# Altium schematic symbol library resistors.SchLib: 2602 symbols (part 18 of 18)
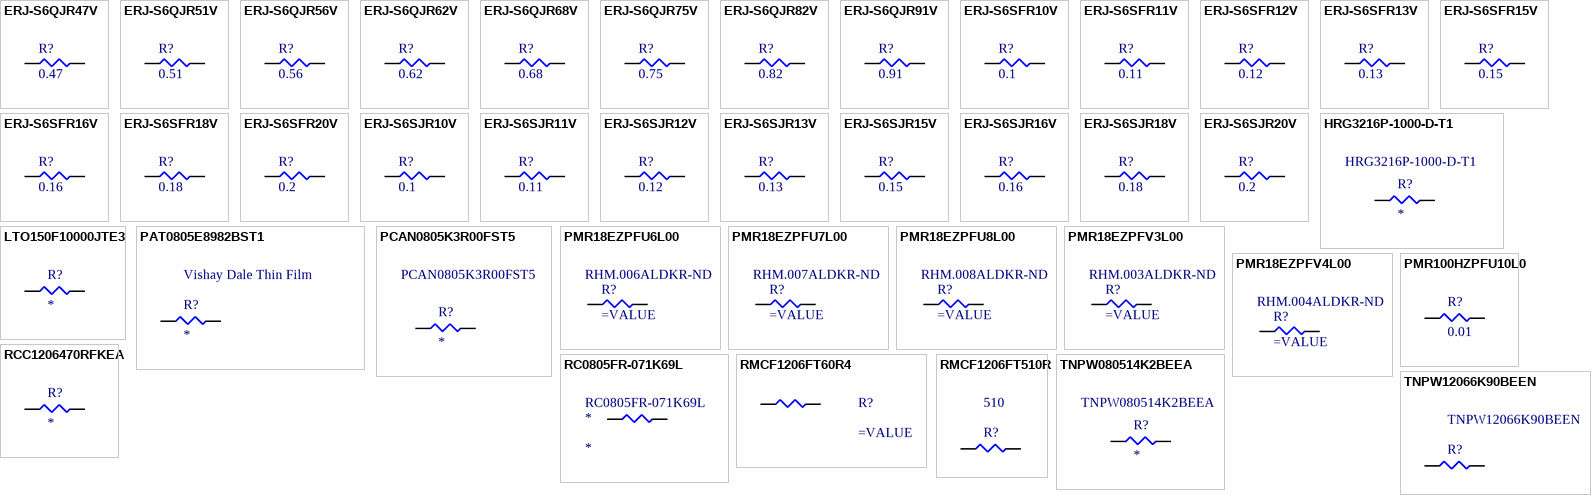
[diagram p81: symbols ERJ-S6QJR47V to TNPW080514K2BEEA]

## ERJ-S6SJR11V
designator R?, comment 0.11
RES SMD 0.11 OHM 5% 1/4W 0805; Part Number: ERJ-S6SJR11V; Manufacturer: Panasonic Electronic Components; Factory Stock: 0; Unit Price (USD): 0.07603; @ qty: 1500; Minimum Quantity: 1; Power (Watts): 0.25W, 1/4W; Temperature Coefficient: ±150ppm/°C; Datasheets: https://industrial.panasonic.com/cdbs/www-data/pdf/RDA0000/AOA0000CE5.pdf; Image: //media.digikey.com/Renders/Panasonic%20Renders/ERJ-0805%20Pkg.jpg; Digi-Key Part Number: P.11BKCT-ND; Quantity Available: 9666; Packaging: Cut Tape (CT); Series: ERJ; Part Status: Active; Value: 0.11; Tolerance: ±5%; Composition: Thick Film; Features: Anti-Sulfur, Automotive AEC-Q200; Operating Temperature: -55°C ~ 155°C; Package / Case: 0805 (2012 Metric); Supplier Device Package: 0805; Size / Dimension: 0.079" L x 0.049" W (2.00mm x 1.25mm); Height - Seated (Max): 0.026" (0.65mm); Number of Terminations: 2; Failure Rate: -
footprint SMD-0805-RES
pins: 1, 2

## ERJ-S6SJR12V
designator R?, comment 0.12
RES SMD 0.12 OHM 5% 1/4W 0805; Part Number: ERJ-S6SJR12V; Manufacturer: Panasonic Electronic Components; Factory Stock: 0; Unit Price (USD): 0.07603; @ qty: 1500; Minimum Quantity: 1; Power (Watts): 0.25W, 1/4W; Temperature Coefficient: ±150ppm/°C; Datasheets: https://industrial.panasonic.com/cdbs/www-data/pdf/RDA0000/AOA0000CE5.pdf; Image: //media.digikey.com/Renders/Panasonic%20Renders/ERJ-0805%20Pkg.jpg; Digi-Key Part Number: P.12BKCT-ND; Quantity Available: 9061; Packaging: Cut Tape (CT); Series: ERJ; Part Status: Active; Value: 0.12; Tolerance: ±5%; Composition: Thick Film; Features: Anti-Sulfur, Automotive AEC-Q200; Operating Temperature: -55°C ~ 155°C; Package / Case: 0805 (2012 Metric); Supplier Device Package: 0805; Size / Dimension: 0.079" L x 0.049" W (2.00mm x 1.25mm); Height - Seated (Max): 0.026" (0.65mm); Number of Terminations: 2; Failure Rate: -
footprint SMD-0805-RES
pins: 1, 2

## ERJ-S6SJR13V
designator R?, comment 0.13
RES SMD 0.13 OHM 5% 1/4W 0805; Part Number: ERJ-S6SJR13V; Manufacturer: Panasonic Electronic Components; Factory Stock: 0; Unit Price (USD): 0.07603; @ qty: 1500; Minimum Quantity: 1; Power (Watts): 0.25W, 1/4W; Temperature Coefficient: ±150ppm/°C; Datasheets: https://industrial.panasonic.com/cdbs/www-data/pdf/RDA0000/AOA0000CE5.pdf; Image: //media.digikey.com/Renders/Panasonic%20Renders/ERJ-0805%20Pkg.jpg; Digi-Key Part Number: P.13BKCT-ND; Quantity Available: 5683; Packaging: Cut Tape (CT); Series: ERJ; Part Status: Active; Value: 0.13; Tolerance: ±5%; Composition: Thick Film; Features: Anti-Sulfur, Automotive AEC-Q200; Operating Temperature: -55°C ~ 155°C; Package / Case: 0805 (2012 Metric); Supplier Device Package: 0805; Size / Dimension: 0.079" L x 0.049" W (2.00mm x 1.25mm); Height - Seated (Max): 0.026" (0.65mm); Number of Terminations: 2; Failure Rate: -
footprint SMD-0805-RES
pins: 1, 2

## ERJ-S6SJR15V
designator R?, comment 0.15
RES SMD 0.15 OHM 5% 1/4W 0805; Part Number: ERJ-S6SJR15V; Manufacturer: Panasonic Electronic Components; Factory Stock: 0; Unit Price (USD): 0.07603; @ qty: 1500; Minimum Quantity: 1; Power (Watts): 0.25W, 1/4W; Temperature Coefficient: ±150ppm/°C; Datasheets: https://industrial.panasonic.com/cdbs/www-data/pdf/RDA0000/AOA0000CE5.pdf; Image: //media.digikey.com/Renders/Panasonic%20Renders/ERJ-0805%20Pkg.jpg; Digi-Key Part Number: P.15BKCT-ND; Quantity Available: 15525; Packaging: Cut Tape (CT); Series: ERJ; Part Status: Active; Value: 0.15; Tolerance: ±5%; Composition: Thick Film; Features: Anti-Sulfur, Automotive AEC-Q200; Operating Temperature: -55°C ~ 155°C; Package / Case: 0805 (2012 Metric); Supplier Device Package: 0805; Size / Dimension: 0.079" L x 0.049" W (2.00mm x 1.25mm); Height - Seated (Max): 0.026" (0.65mm); Number of Terminations: 2; Failure Rate: -
footprint SMD-0805-RES
pins: 1, 2

## ERJ-S6SJR16V
designator R?, comment 0.16
RES SMD 0.16 OHM 5% 1/4W 0805; Part Number: ERJ-S6SJR16V; Manufacturer: Panasonic Electronic Components; Factory Stock: 0; Unit Price (USD): 0.07603; @ qty: 1500; Minimum Quantity: 1; Power (Watts): 0.25W, 1/4W; Temperature Coefficient: ±150ppm/°C; Datasheets: https://industrial.panasonic.com/cdbs/www-data/pdf/RDA0000/AOA0000CE5.pdf; Image: //media.digikey.com/Renders/Panasonic%20Renders/ERJ-0805%20Pkg.jpg; Digi-Key Part Number: P.16BKCT-ND; Quantity Available: 9606; Packaging: Cut Tape (CT); Series: ERJ; Part Status: Active; Value: 0.16; Tolerance: ±5%; Composition: Thick Film; Features: Anti-Sulfur, Automotive AEC-Q200; Operating Temperature: -55°C ~ 155°C; Package / Case: 0805 (2012 Metric); Supplier Device Package: 0805; Size / Dimension: 0.079" L x 0.049" W (2.00mm x 1.25mm); Height - Seated (Max): 0.026" (0.65mm); Number of Terminations: 2; Failure Rate: -
footprint SMD-0805-RES
pins: 1, 2

## ERJ-S6SJR18V
designator R?, comment 0.18
RES SMD 0.18 OHM 5% 1/4W 0805; Part Number: ERJ-S6SJR18V; Manufacturer: Panasonic Electronic Components; Factory Stock: 0; Unit Price (USD): 0.07603; @ qty: 1500; Minimum Quantity: 1; Power (Watts): 0.25W, 1/4W; Temperature Coefficient: ±150ppm/°C; Datasheets: https://industrial.panasonic.com/cdbs/www-data/pdf/RDA0000/AOA0000CE5.pdf; Image: //media.digikey.com/Renders/Panasonic%20Renders/ERJ-0805%20Pkg.jpg; Digi-Key Part Number: P.18BKCT-ND; Quantity Available: 3859; Packaging: Cut Tape (CT); Series: ERJ; Part Status: Discontinued at Digi-Key; Value: 0.18; Tolerance: ±5%; Composition: Thick Film; Features: Anti-Sulfur, Automotive AEC-Q200; Operating Temperature: -55°C ~ 155°C; Package / Case: 0805 (2012 Metric); Supplier Device Package: 0805; Size / Dimension: 0.079" L x 0.049" W (2.00mm x 1.25mm); Height - Seated (Max): 0.026" (0.65mm); Number of Terminations: 2; Failure Rate: -
footprint SMD-0805-RES
pins: 1, 2

## ERJ-S6SJR20V
designator R?, comment 0.2
RES SMD 0.2 OHM 5% 1/4W 0805; Part Number: ERJ-S6SJR20V; Manufacturer: Panasonic Electronic Components; Factory Stock: 0; Unit Price (USD): 0.07603; @ qty: 1500; Minimum Quantity: 1; Power (Watts): 0.25W, 1/4W; Temperature Coefficient: ±150ppm/°C; Datasheets: https://industrial.panasonic.com/cdbs/www-data/pdf/RDA0000/AOA0000CE5.pdf; Image: //media.digikey.com/Renders/Panasonic%20Renders/ERJ-0805%20Pkg.jpg; Digi-Key Part Number: P.2BKCT-ND; Quantity Available: 14281; Packaging: Cut Tape (CT); Series: ERJ; Part Status: Active; Value: 0.2; Tolerance: ±5%; Composition: Thick Film; Features: Anti-Sulfur, Automotive AEC-Q200; Operating Temperature: -55°C ~ 155°C; Package / Case: 0805 (2012 Metric); Supplier Device Package: 0805; Size / Dimension: 0.079" L x 0.049" W (2.00mm x 1.25mm); Height - Seated (Max): 0.026" (0.65mm); Number of Terminations: 2; Failure Rate: -
footprint SMD-0805-RES
pins: 1, 2

## HRG3216P-1000-D-T1
designator R?  Manufacturer Part Number: HRG3216P-1000-D-T1
Fixed Resistor, Thin Film, 1W, 100ohm, 200V, 0.5% +/-Tol, 25ppm/Cel, Surface Mount, 1206; Manufacturer: Susumu; Additional Feature: ANTI-SULFUR; Rated Temperature: 70°C; Resistance: 100R; Temperature Coefficient: 25ppm/°C; Package Height: 0.4mm; Package Length: 3.2mm; Package Width: 1.6mm; Reference Standard: AEC-Q200; Supplier 1: Digi-Key; RoHS: Yes; Category: Chip SMD Resistors; Stock 1: 24654; Pricing 1: 1=0.88000, 10=0.76200, 100=0.53130 (USD); Mount: Surface Mount; Number of Pins: 2; Size Code: 1206; Min Operating Temperature: -55°C; Max Operating Temperature: 155°C; Tolerance: 0.5%; Resistor Type: FIXED RESISTOR; Construction: Rectangular; Package Style: SMTMeter; Packaging: Tape and Reel; Rated Power Dissipation (P): 1W; Technology: THIN FILM; Termination: Wraparound; Working Voltage: 200V; REACH SVHC: Yes; RoHS Compliant: Yes; ComponentLink1URL: https://datasheet.ciiva.com:443/pdfs/VipMasterIC/IC/SUSU/SUSU-S-A0004582570/SUSU-S-A0004582570-1.pdf?src-supplier=IHS+Markit; ComponentLink1Description: https://datasheet.ciiva.com:443/pdfs/VipMasterIC/IC/SUSU/SUSU-S-A0004582570/SUSU-S-A0004582570-1.pdf?src-supplier=IHS+Markit; ComponentLink2URL: http://www.farnell.com/datasheets/2643250.pdf?src-supplier=Farnell; ComponentLink2Description: http://www.farnell.com/datasheets/2643250.pdf?src-supplier=Farnell; ComponentLink3URL: http://www.susumu.co.jp/common/pdf/n_catalog_partition24_en.pdf?src-supplier=Digi-Key; ComponentLink3Description: http://www.susumu.co.jp/common/pdf/n_catalog_partition24_en.pdf?src-supplier=Digi-Key; ComponentLink4URL: http://www.farnell.com/datasheets/2643250.pdf?src-supplier=Newark; ComponentLink4Description: http://www.farnell.com/datasheets/2643250.pdf?src-supplier=Newark; ComponentLink5URL: http://www.farnell.com/datasheets/2643250.pdf?src-supplier=Element14; ComponentLink5Description: http://www.farnell.com/datasheets/2643250.pdf?src-supplier=Element14; Supplier Part Number 1: 408-1865-1-ND
footprint SMD-1206-RES
pins: 1, 2

## LTO150F10000JTE3
designator R?
RES 1K OHM 5% 150W TO247-2; Manufacturer: Vishay Sfernice; Manufacturer Part Number: LTO150F10000JTE3; Supplier 1: Digi-Key; Stock 1: 9; Pricing 1: 1=12.19, 10=11.084, 100=7.8972, 1000=7.17808 (USD); ComponentLink1URL: https://media.digikey.com/pdf/Data%20Sheets/Vishay%20Sfernice%20PDFs/LTO_150_Series.pdf?src-supplier=Digi-Key; ComponentLink1Description: https://media.digikey.com/pdf/Data%20Sheets/Vishay%20Sfernice%20PDFs/LTO_150_Series.pdf?src-supplier=Digi-Key; Supplier Part Number 1: 716-1214-ND; Digikey Link: https://www.digikey.com/products/en/resistors/through-hole-resistors/53?k=Power+Resistors&k=&pkeyword=Power+Resistors&sv=0&pv2=127&sf=0&FV=ffe00035%2Cmu1kOhms%7C2085%7C0%2Cmu1kOhms%7C2085%7C1&quantity=&ColumnSort=0&page=1&pageSize=25
footprint TO-247-2
pins: 1, 2

## PAT0805E8982BST1
designator R?  Manufacturer: Vishay Dale Thin Film
Res Thin Film 0805 89.8K Ohm 0.1% 0.2W(1/5W) ±25ppm/C Sulfur Resistant Pad SMD Automotive T/R; Manufacturer Part Number: PAT0805E8982BST1; Voltage Rating: 100V; Power Rating: 200mW; Resistance: 89.8kR; Temperature Coefficient: 25ppm/°C; Supplier 1: Mouser; RoHS: Yes; Category: Chip SMD Resistors; Stock 1: 1783; Pricing 1: 1=0.77000, 10=0.67900, 50=0.65900, 100=0.49000, 1000=0.32600, 10000=0.30000 (USD); Case/Package: 0805; Case Code (Imperial): 0805; Case Code (Metric): 2012; Min Operating Temperature: -55°C; Max Operating Temperature: 155°C; Package Quantity: 1; Packaging: Tape and Reel; Tolerance: 0.1%; Resistor Type: Thin Film; Number of Terminations: 2; Max Power Dissipation: 200mW; Features: Moisture Resistant,Automotive AEC-Q200,Anti-Sulfur; Series: PAT; Length: 0.08inch; Width: 1.27mm; Height: 0.018inch; RoHS Compliant: Yes; ComponentLink1URL: https://datasheet.ciiva.com/2504/pat-2504445.pdf?src-supplier=Digi-Key; ComponentLink1Description: https://datasheet.ciiva.com/2504/pat-2504445.pdf?src-supplier=Digi-Key; ComponentLink2URL: https://datasheet.ciiva.com/2504/pat-2504446.pdf?src-supplier=Digi-Key; ComponentLink2Description: https://datasheet.ciiva.com/2504/pat-2504446.pdf?src-supplier=Digi-Key; ComponentLink3URL: https://datasheet.ciiva.com/2504/pat-2504447.pdf?src-supplier=Digi-Key; ComponentLink3Description: https://datasheet.ciiva.com/2504/pat-2504447.pdf?src-supplier=Digi-Key; ComponentLink4URL: https://datasheet.ciiva.com/5622/pat-247403-5622939.pdf?src-supplier=Mouser; ComponentLink4Description: https://datasheet.ciiva.com/5622/pat-247403-5622939.pdf?src-supplier=Mouser; Supplier Part Number 1: 71-PAT0805E8982BST1
footprint SMD-0805-RES
pins: 1, 2

## PCAN0805K3R00FST5
designator R?  Manufacturer Part Number: PCAN0805K3R00FST5
Fixed Resistor; Manufacturer: Vishay Dale Thin Film; Manufacturer Series: PCAN; Supplier 1: Digi-Key; RoHS: Yes; Category: Chip SMD Resistors; Stock 1: 1500; Pricing 1: 500=1.51200, 1000=1.31040 (USD); Number of Pins: 2; Resistor Type: FIXED RESISTOR; REACH SVHC: No SVHC; RoHS Compliant: Yes; ComponentLink1URL: https://datasheet.ciiva.com:443/pdfs/VipMasterIC/IC/VISH/VISH-S-A0001545402/VISH-S-A0001545402-1.pdf?src-supplier=IHS+Markit; ComponentLink1Description: https://datasheet.ciiva.com:443/pdfs/VipMasterIC/IC/VISH/VISH-S-A0001545402/VISH-S-A0001545402-1.pdf?src-supplier=IHS+Markit; ComponentLink2URL: http://www.vishay.com/docs/60125/pcan.pdf?src-supplier=Digi-Key; ComponentLink2Description: http://www.vishay.com/docs/60125/pcan.pdf?src-supplier=Digi-Key; ComponentLink3URL: http://www.vishay.com/docs/49563/_pcan_vmn-pt0416.pdf?src-supplier=Digi-Key; ComponentLink3Description: http://www.vishay.com/docs/49563/_pcan_vmn-pt0416.pdf?src-supplier=Digi-Key; Supplier Part Number 1: 764-1232-2-ND
footprint SMD-0805-RES
pins: 1, 2

## PMR18EZPFU6L00
designator R?  Supplier Part Number 1: RHM.006ALDKR-ND
RES SMD 0.006 OHM 1% 1W 1206; Manufacturer: Rohm; Manufacturer Part Number: PMR18EZPFU6L00; Resistance: 6mR; Temperature Coefficient: 100ppm/°C; Supplier 1: Digi-Key; Stock 1: 17676; Pricing 1: 1=0.73, 10=0.54, 25=0.4384, 50=0.3812, 100=0.3144, 250=0.27316, 500=0.22234, 1000=0.17635 (USD); Case/Package: 1206; Case Code (Metric): 3216; Case Code (Imperial): 1206; Min Operating Temperature: -55°C; Max Operating Temperature: 155°C; Power Rating: 1W; Tolerance: 1%; Packaging: Tape and Reel; Package Quantity: 1; Composition: Thick Film; Number of Terminations: 2; Max Power Dissipation: 1W; Features: Automotive AEC-Q200; Length: 0.126inch; Height: 0.022inch; Width: 0.063inch; Lead Free: Lead Free; ComponentLink1URL: https://www.rohm.com/datasheet/PMR18EZPFV/pmr-e?src-supplier=Digi-Key; ComponentLink1Description: https://www.rohm.com/datasheet/PMR18EZPFV/pmr-e?src-supplier=Digi-Key; ComponentLink2URL: http://www.rohm.com/web/global/datasheet/PMR18EZPFV/pmr-e?src-supplier=Digi-Key; ComponentLink2Description: http://www.rohm.com/web/global/datasheet/PMR18EZPFV/pmr-e?src-supplier=Digi-Key
footprint SMD-1206-RES
pins: 1, 2

## PMR18EZPFU7L00
designator R?  Supplier Part Number 1: RHM.007ALDKR-ND
RES SMD 0.007 OHM 1% 1W 1206; Manufacturer: Rohm; Manufacturer Part Number: PMR18EZPFU7L00; Resistance: 7mR; Temperature Coefficient: 100ppm/°C; Supplier 1: Digi-Key; Stock 1: 11425; Pricing 1: 1=0.73, 10=0.54, 25=0.4384, 50=0.3812, 100=0.3144, 250=0.27316, 500=0.22234, 1000=0.17635 (USD); Case/Package: 1206; Case Code (Metric): 3216; Case Code (Imperial): 1206; Min Operating Temperature: -55°C; Max Operating Temperature: 155°C; Power Rating: 1W; Tolerance: 1%; Packaging: Tape and Reel; Package Quantity: 1; Composition: Thick Film; Number of Terminations: 2; Max Power Dissipation: 1W; Features: Automotive AEC-Q200; Length: 0.126inch; Height: 0.022inch; Width: 0.063inch; Lead Free: Lead Free; ComponentLink1URL: http://www.rohm.com/web/global/datasheet/PMR18EZPFV/pmr-e?src-supplier=Digi-Key; ComponentLink1Description: http://www.rohm.com/web/global/datasheet/PMR18EZPFV/pmr-e?src-supplier=Digi-Key; ComponentLink2URL: https://www.rohm.com/datasheet/PMR18EZPFV/pmr-e?src-supplier=Digi-Key; ComponentLink2Description: https://www.rohm.com/datasheet/PMR18EZPFV/pmr-e?src-supplier=Digi-Key
footprint SMD-1206-RES
pins: 1, 2

## PMR18EZPFU8L00
designator R?  Supplier Part Number 1: RHM.008ALDKR-ND
RES SMD 0.008 OHM 1% 1W 1206; Manufacturer: Rohm; Manufacturer Part Number: PMR18EZPFU8L00; Resistance: 8mR; Temperature Coefficient: 100ppm/°C; Supplier 1: Digi-Key; Stock 1: 23291; Pricing 1: 1=0.73, 10=0.54, 25=0.4384, 50=0.3812, 100=0.3144, 250=0.27316, 500=0.22234, 1000=0.17635 (USD); Case/Package: 1206; Case Code (Metric): 3216; Case Code (Imperial): 1206; Min Operating Temperature: -55°C; Max Operating Temperature: 155°C; Tolerance: 1%; Packaging: Tape and Reel; Package Quantity: 1; Composition: Thick Film; Number of Terminations: 2; Max Power Dissipation: 1W; Features: Automotive AEC-Q200; Length: 0.126inch; Height: 0.022inch; Width: 0.063inch; Lead Free: Lead Free; ComponentLink1URL: https://www.rohm.com/datasheet/PMR18EZPFV/pmr-e?src-supplier=Digi-Key; ComponentLink1Description: https://www.rohm.com/datasheet/PMR18EZPFV/pmr-e?src-supplier=Digi-Key
footprint SMD-1206-RES
pins: 1, 2

## PMR18EZPFV3L00
designator R?  Supplier Part Number 1: RHM.003ALDKR-ND
RES SMD 0.003 OHM 1% 1W 1206; Manufacturer: Rohm; Manufacturer Part Number: PMR18EZPFV3L00; Resistance: 3mR; Temperature Coefficient: 100ppm/°C; Supplier 1: Digi-Key; Stock 1: 0; Case/Package: 1206; Case Code (Metric): 3216; Case Code (Imperial): 1206; Min Operating Temperature: -55°C; Max Operating Temperature: 155°C; Package Quantity: 1; Tolerance: 1%; Packaging: Tape and Reel; Composition: Thick Film; Number of Terminations: 2; Power Dissipation: 1W; Max Power Dissipation: 1W; Features: Automotive AEC-Q200; Length: 0.126inch; Height: 0.022inch; Width: 0.063inch; Lead Free: Lead Free; ComponentLink1URL: https://www.rohm.com/datasheet/PMR18EZPFV/pmr-e?src-supplier=Digi-Key; ComponentLink1Description: https://www.rohm.com/datasheet/PMR18EZPFV/pmr-e?src-supplier=Digi-Key; ComponentLink2URL: http://rohmfs.rohm.com/en/products/databook/datasheet/passive/resistor/chip_resistor/pmr.pdf?src-supplier=Future+Electronics; ComponentLink2Description: http://rohmfs.rohm.com/en/products/databook/datasheet/passive/resistor/chip_resistor/pmr.pdf?src-supplier=Future+Electronics
footprint SMD-1206-RES
pins: 1, 2

## PMR18EZPFV4L00
designator R?  Supplier Part Number 1: RHM.004ALDKR-ND
RES SMD 0.004 OHM 1% 1W 1206; Manufacturer: Rohm; Manufacturer Part Number: PMR18EZPFV4L00; Resistance: 4mR; Temperature Coefficient: 100ppm/°C; Supplier 1: Digi-Key; Stock 1: 28741; Pricing 1: 1=0.73, 10=0.54, 25=0.4384, 50=0.3812, 100=0.3144, 250=0.27316, 500=0.22234, 1000=0.17635 (USD); Case/Package: 1206; Case Code (Metric): 3216; Case Code (Imperial): 1206; Min Operating Temperature: -55°C; Max Operating Temperature: 155°C; Package Quantity: 1; Tolerance: 1%; Packaging: Tape and Reel; Composition: Thick Film; Number of Terminations: 2; Max Power Dissipation: 1W; Features: Automotive AEC-Q200; Length: 0.126inch; Height: 0.022inch; Width: 0.063inch; Lead Free: Lead Free; ComponentLink1URL: http://www.rohm.com/web/global/datasheet/PMR18EZPFV/pmr-e?src-supplier=Digi-Key; ComponentLink1Description: http://www.rohm.com/web/global/datasheet/PMR18EZPFV/pmr-e?src-supplier=Digi-Key; ComponentLink2URL: https://www.rohm.com/datasheet/PMR18EZPFV/pmr-e?src-supplier=Digi-Key; ComponentLink2Description: https://www.rohm.com/datasheet/PMR18EZPFV/pmr-e?src-supplier=Digi-Key
footprint SMD-1206-RES
pins: 1, 2

## PMR100HZPFU10L0
designator R?, comment 0.01
Fixed Resistor, Metal Strip, 2W, 0.01ohm, 1% +/-Tol, 100ppm/Cel, Surface Mount, 2512; Manufacturer: Rohm; Manufacturer Part Number: PMR100HZPFU10L0; Rated Temperature: 70°C; Resistance: 10mR; Temperature Coefficient: 100ppm/°C; Package Length: 6.4mm; Package Width: 3.2mm; Reference Standard: AEC-Q200; Supplier 1: Digi-Key; RoHS: Yes; Category: Chip SMD Resistors; Stock 1: 174138; Pricing 1: 1=0.70000, 10=0.51800, 25=0.42080, 50=0.36600, 100=0.30200, 250=0.26232, 500=0.21350, 1000=0.16934 (USD); Mount: Surface Mount; Number of Pins: 2; Package Shape: Rectangular; Size Code: 2512; Terminal Finish: Nickel; Min Operating Temperature: -55°C; Max Operating Temperature: 155°C; Tolerance: 1%; JESD-609 Code: e3; Resistor Type: FIXED RESISTOR; Construction: Chip; Package Style: SMTMeter; Packaging: Tape and Reel; Rated Power Dissipation (P): 2W; Technology: METAL ALLOY; Termination: Wraparound; REACH SVHC: Yes; RoHS Compliant: Yes; ComponentLink1URL: https://datasheet.ciiva.com:443/pdfs/VipMasterIC/IC/ROHM/ROHM-S-A0002955119/ROHM-S-A0002955119-1.pdf?src-supplier=IHS+Markit; ComponentLink1Description: https://datasheet.ciiva.com:443/pdfs/VipMasterIC/IC/ROHM/ROHM-S-A0002955119/ROHM-S-A0002955119-1.pdf?src-supplier=IHS+Markit; ComponentLink2URL: https://datasheet.ciiva.com/2481/pmr-2481518.pdf?src-supplier=Digi-Key; ComponentLink2Description: https://datasheet.ciiva.com/2481/pmr-2481518.pdf?src-supplier=Digi-Key; ComponentLink3URL: https://datasheet.ciiva.com/2481/pmr-2481519.pdf?src-supplier=Digi-Key; ComponentLink3Description: https://datasheet.ciiva.com/2481/pmr-2481519.pdf?src-supplier=Digi-Key; ComponentLink4URL: https://datasheet.ciiva.com/2481/pmr-2481517.pdf?src-supplier=Digi-Key; ComponentLink4Description: https://datasheet.ciiva.com/2481/pmr-2481517.pdf?src-supplier=Digi-Key; ComponentLink5URL: https://datasheet.ciiva.com/16477/pmr-16477834.pdf?src-supplier=Future+Electronics; ComponentLink5Description: https://datasheet.ciiva.com/16477/pmr-16477834.pdf?src-supplier=Future+Electronics; Supplier Part Number 1: RHM.010AUCT-ND
footprint SMD-2512 (Chip Resistor, 2-Leads, Body 6.35x3.20mm, IPC Medium Density)
pins: 1, 2

## RC0805FR-071K69L
designator *  Supplier Part Number 1: RC0805FR-071K69L
Fixed Resistor, Metal Glaze/thick Film, 0.125W, 1690ohm, 150V, 1% +/-Tol, 100ppm/Cel, Surface Mount, 0805; Manufacturer: Yageo; Additional Feature: LASER TRIMMABLE; Rated Power Dissipation (P): 125mW; Rated Temperature: 70°C; Resistance: 1.69kR; Temperature Coefficient: 100ppm/°C; Package Height: 0.5mm; Package Length: 2mm; Package Width: 1.25mm; Supplier 1: Arrow Electronics; Manufacturer Part Number: RC0805FR-071K69L; RoHS: Yes; Category: Chip SMD Resistors; Stock 1: 5000; Pricing 1: 5000=0.00500, 10000=0.00360, 25000=0.00280, 125000=0.00270 (USD); Mount: Surface Mount; Number of Pins: 2; Package Shape: Rectangular; Size Code: 0805; Terminal Finish: Nickel; Min Operating Temperature: -55°C; Max Operating Temperature: 155°C; Tolerance: 1%; JESD-609 Code: e3; Resistor Type: FIXED RESISTOR; Construction: Chip; Package Style: SMTMeter; Packaging: Tape and Reel; Technology: METAL GLAZE/THICK FILM; Termination: Wraparound; Working Voltage: 150V; REACH SVHC: Yes; RoHS Compliant: Yes; ComponentLink1URL: https://datasheet.ciiva.com:443/pdfs/VipMasterIC/IC/YAGO/YAGO-S-A0008145938/YAGO-S-A0008145938-1.pdf?src-supplier=IHS+Markit; ComponentLink1Description: https://datasheet.ciiva.com:443/pdfs/VipMasterIC/IC/YAGO/YAGO-S-A0008145938/YAGO-S-A0008145938-1.pdf?src-supplier=IHS+Markit; ComponentLink2URL: https://datasheet.ciiva.com/2457/pyu-r-int-thick-7-2457810.pdf?src-supplier=Digi-Key; ComponentLink2Description: https://datasheet.ciiva.com/2457/pyu-r-int-thick-7-2457810.pdf?src-supplier=Digi-Key; ComponentLink3URL: https://datasheet.ciiva.com/2457/pyu-r-int-thick-7-2457811.pdf?src-supplier=Digi-Key; ComponentLink3Description: https://datasheet.ciiva.com/2457/pyu-r-int-thick-7-2457811.pdf?src-supplier=Digi-Key; ComponentLink4URL: https://datasheet.ciiva.com/2457/pyu-r-int-thick-7-2457809.pdf?src-supplier=Digi-Key; ComponentLink4Description: https://datasheet.ciiva.com/2457/pyu-r-int-thick-7-2457809.pdf?src-supplier=Digi-Key; ComponentLink5URL: https://datasheet.ciiva.com/5561/rc0805-5561847.pdf?src-supplier=Mouser; ComponentLink5Description: https://datasheet.ciiva.com/5561/rc0805-5561847.pdf?src-supplier=Mouser; ComponentLink6URL: https://datasheet.ciiva.com/16743/rc0805-16743975.pdf?src-supplier=Future+Electronics; ComponentLink6Description: https://datasheet.ciiva.com/16743/rc0805-16743975.pdf?src-supplier=Future+Electronics
footprint SMD-0805-RES
pins: 1, 2

## RCC1206470RFKEA
designator R?
Fixed Resistor, Metal Glaze/thick Film, 0.5W, 470ohm, 200V, 1% +/-Tol, 100ppm/Cel, Surface Mount, 1206; Manufacturer Part Number: RCC1206470RFKEA; Resistance: 470
footprint SMD-1206-RES
pins: 1, 2

## RMCF1206FT60R4
designator R?
RES SMD 60.4 OHM 1% 1/4W 1206; Manufacturer: Stackpole Electronics; Manufacturer Part Number: RMCF1206FT60R4; Rated Power Dissipation (P): 250mW; Rated Temperature: 70°C; Resistance: 60.4R; Temperature Coefficient: 100ppm/°C; Working Voltage: 200V; Package Height: 0.55mm; Package Length: 3.2mm; Package Width: 1.6mm; Reference Standard: AEC-Q200; Supplier 1: Digi-Key; RoHS: Yes; Category: Chip SMD Resistors; Stock 1: 181362; Pricing 1: 1=0.10000, 10=0.03600, 100=0.01460, 1000=0.00655, 2500=0.00569 (USD); Mount: Surface Mount; Number of Pins: 2; Package Shape: Rectangular; Size Code: 1206; Terminal Finish: Nickel; Min Operating Temperature: -55°C; Max Operating Temperature: 155°C; Tolerance: 1%; JESD-609 Code: e3; Resistor Type: FIXED RESISTOR; Construction: Rectangular; Package Style: SMTMeter; Packaging: Tape and Reel; Technology: METAL GLAZE/THICK FILM; Termination: Wraparound; REACH SVHC: Yes; RoHS Compliant: Yes; ComponentLink1URL: https://datasheet.ciiva.com:443/pdfs/VipMasterIC/IC/SEIE/SEIE-S-A0009541969/SEIE-S-A0009541969-1.pdf?src-supplier=IHS+Markit; ComponentLink1Description: https://datasheet.ciiva.com:443/pdfs/VipMasterIC/IC/SEIE/SEIE-S-A0009541969/SEIE-S-A0009541969-1.pdf?src-supplier=IHS+Markit; ComponentLink2URL: http://components.arrow.com/part/dataview/46947506S7252296N1174?src-supplier=Arrow+Electronics; ComponentLink2Description: http://components.arrow.com/part/dataview/46947506S7252296N1174?src-supplier=Arrow+Electronics; ComponentLink3URL: https://www.seielect.com/catalog/SEI-Packaging.pdf?src-supplier=Digi-Key; ComponentLink3Description: https://www.seielect.com/catalog/SEI-Packaging.pdf?src-supplier=Digi-Key; ComponentLink4URL: https://www.seielect.com/Catalog/SEI-RMCF_RMCP.pdf?src-supplier=Digi-Key; ComponentLink4Description: https://www.seielect.com/Catalog/SEI-RMCF_RMCP.pdf?src-supplier=Digi-Key; ComponentLink5URL: https://www.seielect.com/catalog/SEI-RMCF_RMCP.pdf?src-supplier=Avnet; ComponentLink5Description: https://www.seielect.com/catalog/SEI-RMCF_RMCP.pdf?src-supplier=Avnet; Supplier Part Number 1: RMCF1206FT60R4CT-ND
footprint SMD-1206-RES
pins: 1, 2

## RMCF1206FT510R
designator R?  Resistance: 510  (hidden comment: *)
Fixed Resistor, Metal Glaze/thick Film, 0.25W, 510ohm, 200V, 1% +/-Tol, 100ppm/Cel, Surface Mount, 1206; Manufacturer: Stackpole Electronics; Manufacturer Part Number: RMCF1206FT510R; Rated Power Dissipation (P): 250mW; Rated Temperature: 70°C; Temperature Coefficient: 100ppm/°C; Package Height: 0.55mm; Package Length: 3.2mm; Package Width: 1.6mm; Reference Standard: AEC-Q200; Supplier 1: Digi-Key; RoHS: Yes; Category: Chip SMD Resistors; Stock 1: 51; Pricing 1: 1=0.10000, 10=0.03600, 100=0.01460, 1000=0.00655, 2500=0.00569 (USD); Mount: Surface Mount; Number of Pins: 2; Package Shape: Rectangular; Size Code: 1206; Terminal Finish: Nickel; Min Operating Temperature: -55°C; Max Operating Temperature: 155°C; Tolerance: 1%; JESD-609 Code: e3; Resistor Type: FIXED RESISTOR; Construction: Rectangular; Package Style: SMTMeter; Packaging: Tape and Reel; Technology: METAL GLAZE/THICK FILM; Termination: Wraparound; Working Voltage: 200V; REACH SVHC: Yes; RoHS Compliant: Yes; ComponentLink1URL: https://datasheet.ciiva.com:443/pdfs/VipMasterIC/IC/SEIE/SEIE-S-A0009541969/SEIE-S-A0009541969-1.pdf?src-supplier=IHS+Markit; ComponentLink1Description: https://datasheet.ciiva.com:443/pdfs/VipMasterIC/IC/SEIE/SEIE-S-A0009541969/SEIE-S-A0009541969-1.pdf?src-supplier=IHS+Markit; ComponentLink2URL: http://components.arrow.com/part/dataview/40948710S9551678N1174?src-supplier=Arrow+Electronics; ComponentLink2Description: http://components.arrow.com/part/dataview/40948710S9551678N1174?src-supplier=Arrow+Electronics; ComponentLink3URL: https://www.seielect.com/Catalog/SEI-RMCF_RMCP.pdf?src-supplier=Digi-Key; ComponentLink3Description: https://www.seielect.com/Catalog/SEI-RMCF_RMCP.pdf?src-supplier=Digi-Key; ComponentLink4URL: https://www.seielect.com/catalog/SEI-Packaging.pdf?src-supplier=Digi-Key; ComponentLink4Description: https://www.seielect.com/catalog/SEI-Packaging.pdf?src-supplier=Digi-Key; ComponentLink5URL: https://www.seielect.com/catalog/SEI-RMCF_RMCP.pdf?src-supplier=Avnet; ComponentLink5Description: https://www.seielect.com/catalog/SEI-RMCF_RMCP.pdf?src-supplier=Avnet; Supplier Part Number 1: RMCF1206FT510RCT-ND
footprint SMD-1206-RES
pins: 1, 2

## TNPW12066K90BEEN
designator R?  Manufacturer Part Number: TNPW12066K90BEEN  (hidden comment: *)
Fixed Resistor, Thin Film, 0.25W, 6900ohm, 200V, 0.1% +/-Tol, 25ppm/Cel, Surface Mount, 1206; Manufacturer: Vishay; Manufacturer Series: TNPW; Rated Power Dissipation (P): 250mW; Rated Temperature: 70°C; Resistance: 6.9kR; Temperature Coefficient: 25ppm/°C; Supplier 1: Mouser; RoHS: Yes; Category: Chip SMD Resistors; Stock 1: 672; Pricing 1: 1=0.92000, 10=0.82300, 50=0.82300, 100=0.62200, 1000=0.31000, 10000=0.30500 (USD); Mount: Surface Mount; Number of Pins: 2; Package Shape: Rectangular; Size Code: 1206; Terminal Finish: Tin; Min Operating Temperature: -55°C; Max Operating Temperature: 125°C; Tolerance: 0.1%; JESD-609 Code: e3; Resistor Type: FIXED RESISTOR; Packaging: Tape and Reel; Technology: THIN FILM; Termination: Wraparound; Working Voltage: 200V; REACH SVHC: Yes; RoHS Compliant: Yes; ComponentLink1URL: https://datasheet.ciiva.com:443/pdfs/VipMasterIC/IC/DALE/DALES05753/DALES05753-1.pdf?src-supplier=IHS+Markit; ComponentLink1Description: https://datasheet.ciiva.com:443/pdfs/VipMasterIC/IC/DALE/DALES05753/DALES05753-1.pdf?src-supplier=IHS+Markit; ComponentLink2URL: http://www.mouser.com/ds/2/427/tnpw_e3-64594.pdf?src-supplier=Mouser; ComponentLink2Description: http://www.mouser.com/ds/2/427/tnpw_e3-64594.pdf?src-supplier=Mouser; ComponentLink3URL: http://www.vishay.com/docs/28758/tnpw_e3.pdf?src-supplier=Avnet; ComponentLink3Description: http://www.vishay.com/docs/28758/tnpw_e3.pdf?src-supplier=Avnet; Supplier Part Number 1: 71-TNPW12066K90BEEN
footprint SMD-1206-RES
pins: 1, 2

## TNPW080514K2BEEA
designator R?  Manufacturer Part Number: TNPW080514K2BEEA
RES 14.2K OHM 0.1% 1/5W 0805; Manufacturer: Vishay; Rated Power Dissipation (P): 125mW; Rated Temperature: 70°C; Resistance: 14.2kR; Temperature Coefficient: 25ppm/°C; Working Voltage: 150V; Package Height: 0.45mm; Package Length: 2mm; Package Width: 1.25mm; Reference Standard: AEC-Q200; Supplier 1: Mouser; RoHS: Yes; Category: Chip SMD Resistors; Stock 1: 1469; Pricing 1: 1=0.75000, 10=0.54900, 50=0.54900, 100=0.35000, 1000=0.22100, 10000=0.21500 (USD); Mount: Surface Mount; Number of Pins: 2; Size Code: 0805; Terminal Finish: Nickel; Min Operating Temperature: -55°C; Max Operating Temperature: 125°C; Tolerance: 0.1%; Resistor Type: FIXED RESISTOR; Construction: Chip; Package Style: SMTMeter; Packaging: Tape and Reel; Technology: THIN FILM; Termination: Wraparound; REACH SVHC: Yes; RoHS Compliant: Yes; ComponentLink1URL: https://datasheet.ciiva.com:443/pdfs/VipMasterIC/IC/VISH/VISH-S-A0002290253/VISH-S-A0002290253-1.pdf?src-supplier=IHS+Markit; ComponentLink1Description: https://datasheet.ciiva.com:443/pdfs/VipMasterIC/IC/VISH/VISH-S-A0002290253/VISH-S-A0002290253-1.pdf?src-supplier=IHS+Markit; ComponentLink2URL: http://www.mouser.com/ds/2/427/tnpw_e3-64594.pdf?src-supplier=Mouser; ComponentLink2Description: http://www.mouser.com/ds/2/427/tnpw_e3-64594.pdf?src-supplier=Mouser; ComponentLink3URL: http://www.vishay.com/docs/28758/tnpw_e3.pdf?src-supplier=Avnet; ComponentLink3Description: http://www.vishay.com/docs/28758/tnpw_e3.pdf?src-supplier=Avnet; ComponentLink4URL: http://www.vishay.com/docs/28758/tnpw_e3.pdf?src-supplier=Digi-Key; ComponentLink4Description: http://www.vishay.com/docs/28758/tnpw_e3.pdf?src-supplier=Digi-Key; ComponentLink5URL: http://www.vishay.com/docs/28758/tnpw_e3.pdf?src-supplier=Future+Electronics; ComponentLink5Description: http://www.vishay.com/docs/28758/tnpw_e3.pdf?src-supplier=Future+Electronics; Supplier Part Number 1: 71-TNPW080514K2BEEA
footprint SMD-0805-RES
pins: 1, 2

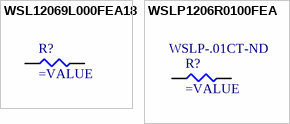
[diagram p65: symbols WSL12069L000FEA18 to WSLP1206R0100FEA]

## WSL12069L000FEA18
designator R?
RES SMD 0.009 OHM 1% 1/2W 1206; Manufacturer: Vishay Dale; Manufacturer Part Number: WSL12069L000FEA18; Resistance: 9mR; Temperature Coefficient: 75ppm/°C; Power Rating: 500mW; Supplier 1: Digi-Key; Stock 1: 8029; Pricing 1: 1=1.54, 10=1.361, 25=1.2508, 50=1.1412, 100=0.9875, 250=0.83392, 500=0.70224, 1000=0.58374 (USD); Mount: Surface Mount; Case/Package: 1206; Contact Plating: Tin,Matte; Case Code (Metric): 3216; Case Code (Imperial): 1206; Min Operating Temperature: -65°C; Max Operating Temperature: 170°C; Tolerance: 1%; Composition: Metal Element,Metal Strip; Package Quantity: 1; Packaging: Tape and Reel; Number of Terminations: 2; Termination: SMD/SMT; Max Power Dissipation: 500mW; Features: Moisture Resistant; Length: 3.2mm; Height: 0.635mm; Width: 0.063inch; Depth: 1.6mm; Radiation Hardening: No; REACH SVHC: Unknown; Lead Free: Lead Free; ComponentLink1URL: http://www.vishay.com/docs/31057/wslhigh.pdf?src-supplier=Digi-Key; ComponentLink1Description: http://www.vishay.com/docs/31057/wslhigh.pdf?src-supplier=Digi-Key; ComponentLink2URL: http://www.farnell.com/datasheets/2049120.pdf?src-supplier=Element14; ComponentLink2Description: http://www.farnell.com/datasheets/2049120.pdf?src-supplier=Element14; Supplier Part Number 1: WSLD-.009DKR-ND
footprint SMD-1206-RES
pins: 1, 2

## WSLP1206R0100FEA
designator R?  Supplier Part Number 1: WSLP-.01CT-ND
RES SMD 0.01 OHM 1% 1W 1206; Manufacturer: Vishay Dale; Manufacturer Part Number: WSLP1206R0100FEA; Resistance: 10mR; Temperature Coefficient: 75ppm/°C; Supplier 1: Digi-Key; Stock 1: 0; Mount: Surface Mount; Case/Package: 1206; Number of Pins: 2; Weight: 0.000571oz; Contact Plating: Tin; Case Code (Metric): 3216; Case Code (Imperial): 1206; Min Operating Temperature: -65°C; Max Operating Temperature: 170°C; Tolerance: 1%; Composition: Metal Element,Metal Strip; Power Rating: 1W; Packaging: Tape and Reel; Number of Terminations: 2; Max Power Dissipation: 1W; Features: Moisture Resistant; Package Quantity: 1; Termination: SMD/SMT; Military Standard: Not; Length: 3.2mm; Height: 0.635mm; Width: 0.063inch; Depth: 1.6mm; Radiation Hardening: No; REACH SVHC: Unknown; Lead Free: Lead Free; ComponentLink1URL: http://www.vishay.com/docs/30122/wslp.pdf?src-supplier=Digi-Key; ComponentLink1Description: http://www.vishay.com/docs/30122/wslp.pdf?src-supplier=Digi-Key; ComponentLink2URL: http://www.farnell.com/datasheets/2049155.pdf?src-supplier=Element14; ComponentLink2Description: http://www.farnell.com/datasheets/2049155.pdf?src-supplier=Element14
footprint SMD-1206-RES
pins: 1, 2